# Altium footprint library 8-Crystals.PcbLib: 104 footprints (part 6 of 7)
Each footprint in its own frame and in the unit in brackets; x right, y up, seen from the top. Pads: shape width x height; smd on the part's side, far side on the other; paste and mask are expansions set on the pad; w line width, h text height; cw(c..) or ccw(c..) is an arc to the next point about the centre after c.
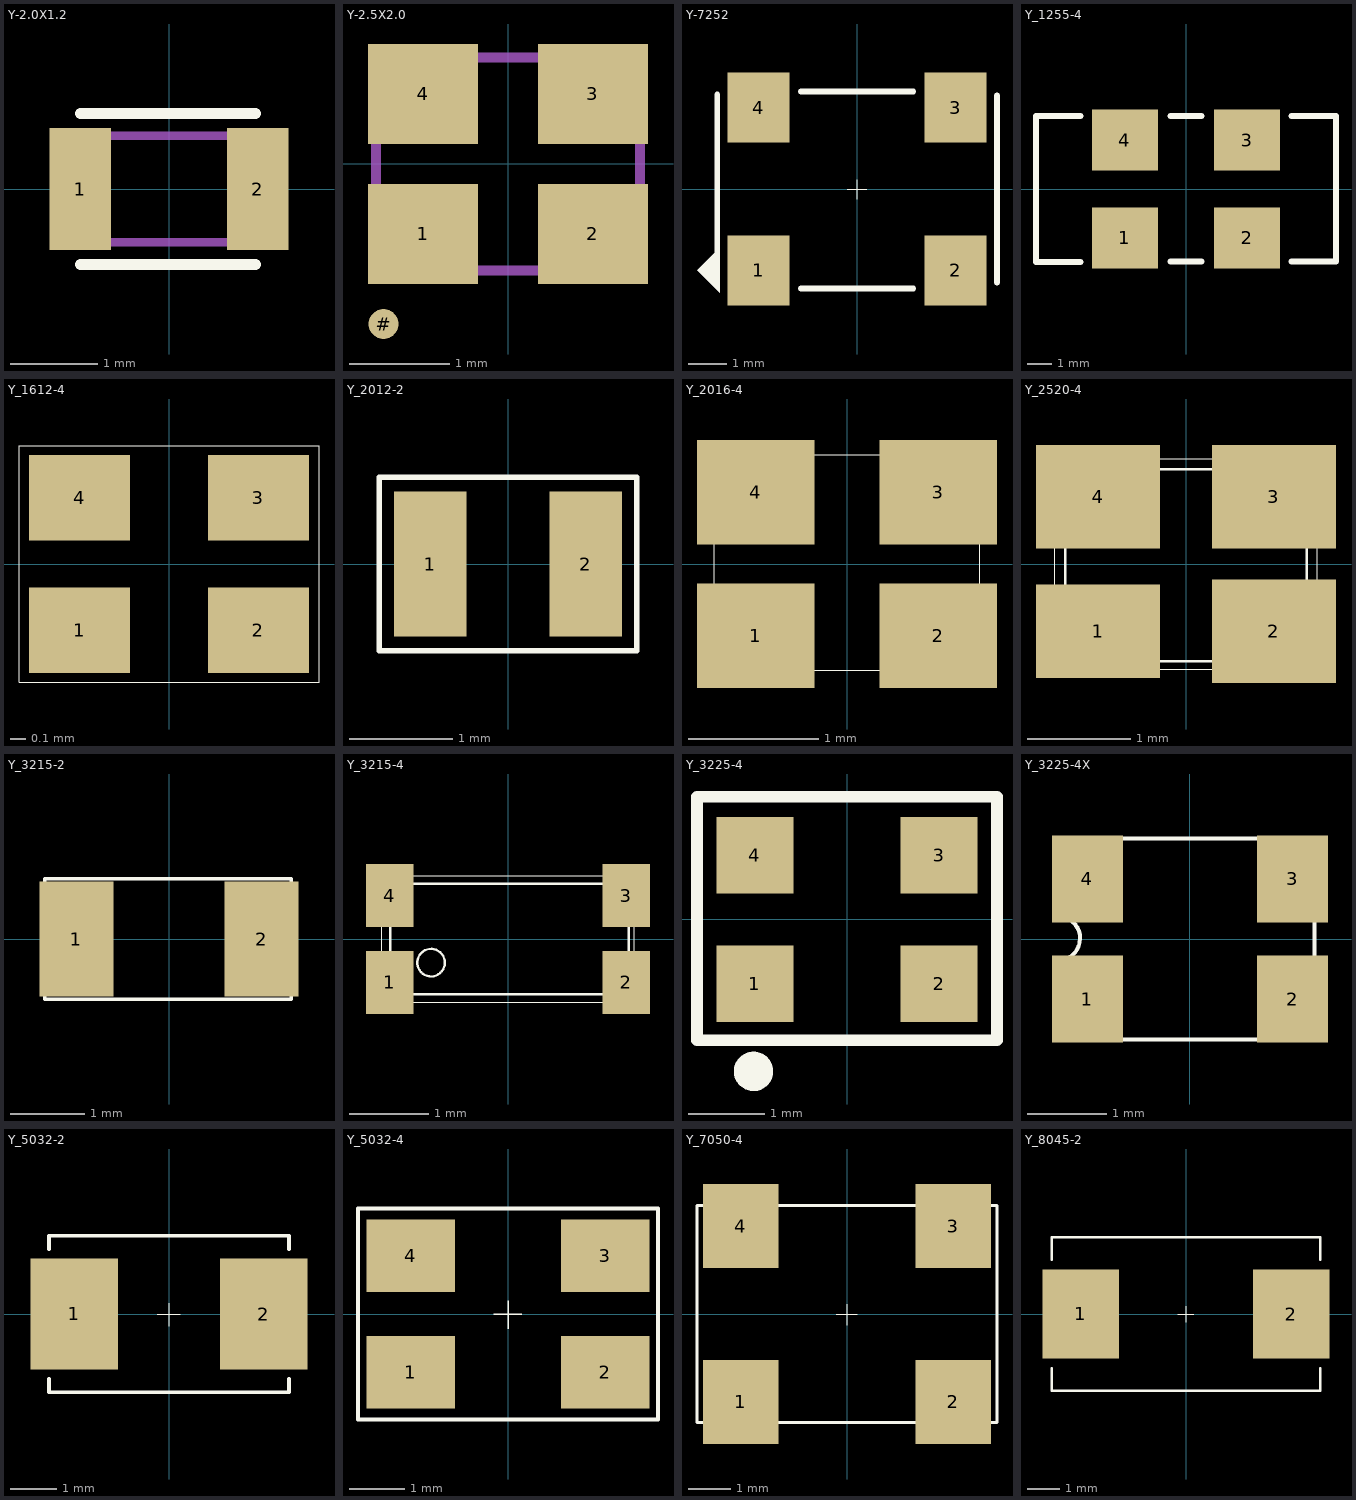
[diagram p5: the footprints below, top view; thin cyan lines are the x and y axes]

## Y-2.0X1.2 [mm]
height 8.78
pads (2):
  rect 0.7x1.4 smd mask+0.07: 1(-1.016,0) 2(1.016,0)
Top Overlay:
  lines w0.127: -1.009,-0.864 0.991,-0.864 ; -1.009,0.864 0.991,0.864
Mechanical 15:
  lines w0.1: -0.991,-0.61 -0.991,0.61 1.016,0.61 1.016,-0.61 -0.991,-0.61
3D body "abs06.stp": height 0.6, standoff 0, extent -1,-0.6 1,0.6
3D body "0_762-1_2.stp": height 0.01, standoff 0, extent 0.635,-0.6 1.397,0.6
3D body "0_762-1_2.stp": height 0.01, standoff 0, extent -1.397,-0.6 -0.635,0.6
3D body "p140-070.stp": height 0.02, standoff 0, extent -1.366,-0.7 -0.666,0.7
3D body "p140-070.stp": height 0.02, standoff 0, extent 0.666,-0.7 1.366,0.7

## Y-2.5X2.0 [mm]
height 8.78
pads (5):
  rect 1.1x1 smd mask+0.07: 1(-0.85,-0.7) 2(0.85,-0.7) 3(0.85,0.7) 4(-0.85,0.7)
  round 0.3 smd mask+0.07: #(-1.245,-1.6)
Mechanical 15:
  lines w0.1: -1.321,-1.067 -1.321,1.067 1.321,1.067 1.321,-1.067 -1.321,-1.067
3D body "p110-100.stp": height 0.02, standoff 0, extent -1.4,-1.2 -0.3,-0.2
3D body "p110-100.stp": height 0.02, standoff 0, extent 0.3,-1.2 1.4,-0.2
3D body "p110-100.stp": height 0.02, standoff 0, extent 0.3,0.2 1.4,1.2
3D body "p110-100.stp": height 0.02, standoff 0, extent -1.4,0.2 -0.3,1.2
3D body "fa-20h.stp": height 0.55, standoff 0, extent -1.255,-1 1.245,1

## Y-7252 [mm]
height 8.78
pads (4):
  rect 1.6x1.8 smd mask+0.051: 1(-2.54,-2.1) 2(2.54,-2.1) 3(2.54,2.1) 4(-2.54,2.1)
Top Overlay:
  region: -3.543,-2.68 -4.127,-2.095 -3.543,-1.511
  lines w0.025: -0.259,0 0.249,0 ; 0,-0.264 0,0.236
  lines w0.15: -3.607,-2.515 -3.607,2.438 ; -1.448,-2.565 1.448,-2.565 ; -1.448,2.515 1.448,2.515 ; 3.607,-2.413 3.607,2.413
3D body "p180-160.stp": height 0.02, standoff 0, extent 1.74,-3 3.34,-1.2
3D body "p180-160.stp": height 0.02, standoff 0, extent -3.34,-3 -1.74,-1.2
3D body "p180-160.stp": height 0.02, standoff 0, extent 1.74,1.2 3.34,3
3D body "p180-160.stp": height 0.02, standoff 0, extent -3.34,1.2 -1.74,3
3D body "y_7050-4.stp": height 1.6, standoff 0, extent -3.505,-2.515 3.495,2.486

## Y_1255-4 [mm]
height 8.78
pads (4):
  rect 2.7x2.5 smd mask+0.051: 1(-2.5,-2) 2(2.5,-2) 3(2.5,2) 4(-2.5,2)
Top Overlay:
  lines w0.25: -4.318,-2.997 -6.147,-2.997 -6.147,2.997 -4.318,2.997 ; -0.635,-2.972 0.635,-2.972 ; -0.635,2.997 0.635,2.997 ; 4.318,-2.972 6.147,-2.972 6.147,2.997 4.318,2.997
3D body "p270-250.stp": height 0.02, standoff 0, extent 1.15,-3.25 3.85,-0.75
3D body "p270-250.stp": height 0.02, standoff 0, extent -3.85,-3.25 -1.15,-0.75
3D body "p270-250.stp": height 0.02, standoff 0, extent 1.15,0.75 3.85,3.25
3D body "p270-250.stp": height 0.02, standoff 0, extent -3.85,0.75 -1.15,3.25
3D body "y_1255-4.stp": height 1.8, standoff -0.03, extent -5.882,-2.75 5.918,2.75

## Y_1612-4 [mm]
height 8.78
pads (4):
  rect 0.65x0.55 smd mask+0.051: 1(-0.575,-0.425) 2(0.575,-0.425) 3(0.575,0.425) 4(-0.575,0.425)
Top Overlay:
  circle w0.025: c-0.457,-0.305 r0.076
  lines w0.005: -0.965,-0.762 -0.965,0.762 0.965,0.762 0.965,-0.762 -0.965,-0.762
3D body "y_1612-4.stp": height 0.3, standoff 0, extent -0.813,-0.6 0.788,0.6
3D body "p065-055.stp": height 0.02, standoff 0, extent -0.9,0.15 -0.25,0.7
3D body "p065-055.stp": height 0.02, standoff 0, extent 0.25,0.15 0.9,0.7
3D body "p065-055.stp": height 0.02, standoff 0, extent 0.25,-0.7 0.9,-0.15
3D body "p065-055.stp": height 0.02, standoff 0, extent -0.9,-0.7 -0.25,-0.15

## Y_2012-2 [mm]
height 8.78
pads (2):
  rect 0.7x1.4 smd: 1(-0.75,0) 2(0.75,0)
Top Overlay:
  lines w0.051: -1.245,-0.838 -1.245,0.838 1.245,0.838 1.245,-0.838 -1.245,-0.838
3D body "p140-070.stp": height 0.02, standoff 0, extent 0.4,-0.7 1.1,0.7
3D body "p140-070.stp": height 0.02, standoff 0, extent -1.1,-0.7 -0.4,0.7
3D body "y_2012-2.stp": height 0.6, standoff 0, extent -1.009,-0.6 0.991,0.6

## Y_2016-4 [mm]
height 8.78
pads (4):
  rect 0.9x0.8 smd mask+0.051: 1(-0.7,-0.55) 2(0.7,-0.55) 3(0.7,0.55) 4(-0.7,0.55)
Top Overlay:
  circle w0.025: c-0.635,-0.432 r0.178
  lines w0.005: -1.016,-0.813 -1.016,0.838 1.016,0.838 1.016,-0.813 -1.016,-0.813
3D body "p090-080.stp": height 0.02, standoff 0, extent -1.15,-0.95 -0.25,-0.15
3D body "p090-080.stp": height 0.02, standoff 0, extent 0.25,-0.95 1.15,-0.15
3D body "p090-080.stp": height 0.02, standoff 0, extent 0.25,0.15 1.15,0.95
3D body "p090-080.stp": height 0.02, standoff 0, extent -1.15,0.15 -0.25,0.95
3D body "y_2016-4.stp": height 0.45, standoff 0, extent -1,-0.787 1,0.813

## Y_2520-4 [mm]
height 8.78
pads (4):
  rect 1.2x0.9 smd mask+0.051: 1(-0.85,-0.65)
  rect 1.2x1 smd mask+0.051: 2(0.85,-0.65) 3(0.85,0.65) 4(-0.85,0.65)
Top Overlay:
  circle w0.025: c-0.737,-0.559 r0.152
  lines w0.005: -1.27,-1.016 1.27,-1.016 1.27,1.016 -1.27,1.016 -1.27,-1.016
  lines w0.025: -1.168,-0.889 cw(c-1.168,-0.94) -1.118,-0.94 1.118,-0.94 cw(c1.168,-0.94) 1.168,-0.889 1.168,0.864 cw(c1.168,0.914) 1.118,0.914 -1.118,0.914 cw(c-1.168,0.914) -1.168,0.864 -1.168,-0.889
3D body "p120-100.stp": height 0.02, standoff 0, extent -1.45,-1.15 -0.25,-0.15
3D body "p120-100.stp": height 0.02, standoff 0, extent 0.25,-1.15 1.45,-0.15
3D body "p120-100.stp": height 0.02, standoff 0, extent 0.25,0.15 1.45,1.15
3D body "p120-100.stp": height 0.02, standoff 0, extent -1.45,0.15 -0.25,1.15
3D body "y_2520-4.stp": height 0.45, standoff -0.01, extent -1.255,-1 1.245,1

## Y_3215-2 [mm]
height 8.78
pads (2):
  rect 1x1.55 smd: 1(-1.25,0) 2(1.25,0)
Top Overlay:
  lines w0.051: -1.676,-0.813 1.651,-0.813 1.651,0.813 -1.676,0.813 -1.676,-0.813
3D body "y_3215-2.stp": height 0.8, standoff 0, extent -1.626,-0.762 1.574,0.738
3D body "p155-100.stp": height 0.02, standoff 0, extent -1.75,-0.775 -0.75,0.775
3D body "p155-100.stp": height 0.02, standoff 0, extent 0.75,-0.775 1.75,0.775

## Y_3215-4 [mm]
height 8.78
pads (4):
  rect 0.6x0.8 smd mask+0.051: 1(-1.5,-0.55) 2(1.5,-0.55) 3(1.5,0.55) 4(-1.5,0.55)
Top Overlay:
  circle w0.03: c-0.974,-0.3 r0.174
  lines w0.01: -1.6,-0.8 -1.6,0.8 1.6,0.8 1.6,-0.8 -1.6,-0.8
  lines w0.03: -1.49,-0.7 1.53,-0.7 1.53,0.7 -1.49,0.7 -1.49,-0.7
3D body "y_3215-4.stp": height 0.91, standoff 0, extent -1.6,-0.737 1.6,0.763
3D body "p080-060.stp": height 0.02, standoff 0, extent -1.8,0.15 -1.2,0.95
3D body "p080-060.stp": height 0.02, standoff 0, extent -1.8,-0.95 -1.2,-0.15
3D body "p080-060.stp": height 0.02, standoff 0, extent 1.2,0.15 1.8,0.95
3D body "p080-060.stp": height 0.02, standoff 0, extent 1.2,-0.95 1.8,-0.15

## Y_3225-4 [mm]
height 8.78
pads (4):
  rect 1x1 smd mask+0.051: 1(-1.2,-0.838) 2(1.2,-0.838) 3(1.2,0.838) 4(-1.2,0.838)
Top Overlay:
  circle w0.254: c-1.219,-1.981 r0.13
  lines w0.15: -1.956,-1.575 1.956,-1.575 1.956,1.6 -1.956,1.6 -1.956,-1.575
3D body "p100-100.stp": height 0.02, standoff 0, extent 0.7,-1.338 1.7,-0.338
3D body "p100-100.stp": height 0.02, standoff 0, extent 0.7,0.338 1.7,1.338
3D body "p100-100.stp": height 0.02, standoff 0, extent -1.7,-1.338 -0.7,-0.338
3D body "p100-100.stp": height 0.02, standoff 0, extent -1.7,0.338 -0.7,1.338
3D body "y_3225-4.stp": height 0.86, standoff -0.02, extent -1.6,-1.245 1.6,1.255

## Y_3225-4X [mm]
height 8.78
pads (4):
  rect 0.9x1.1 smd mask+0.051: 1(-1.3,-0.762) 2(1.3,-0.762) 3(1.3,0.762) 4(-1.3,0.762)
Top Overlay:
  lines w0.025: -1.575,-1.143 -1.702,-1.143 -1.702,-0.381 -1.575,-0.381 ; -1.575,0.381 -1.702,0.381 -1.702,1.143 -1.575,1.143 ; 1.575,-1.143 1.702,-1.143 1.702,-0.381 1.575,-0.381 ; 1.575,0.381 1.702,0.381 1.702,1.143 1.575,1.143
  lines w0.051: -1.575,0.268 -1.575,1.27 1.575,1.27 1.575,-1.27 -1.575,-1.27 -1.575,-0.254 ccw(c-1.67,0.009) -1.567,0.268
3D body "y_3225-4.stp": height 0.86, standoff -0.02, extent -1.6,-1.245 1.6,1.255
3D body "p110-090.stp": height 0.02, standoff 0, extent -1.75,0.212 -0.85,1.312
3D body "p110-090.stp": height 0.02, standoff 0, extent 0.85,0.212 1.75,1.312
3D body "p110-090.stp": height 0.02, standoff 0, extent 0.85,-1.312 1.75,-0.212
3D body "p110-090.stp": height 0.02, standoff 0, extent -1.75,-1.312 -0.85,-0.212

## Y_5032-2 [mm]
height 8.78
pads (2):
  rect 1.9x2.4 smd mask+0.051: 1(-2.05,0) 2(2.05,0)
Top Overlay:
  lines w0.025: -0.259,0 0.249,0 ; 0,-0.264 0,0.236
  lines w0.076: -2.6,-1.4 -2.6,-1.7 2.6,-1.7 2.6,-1.4 ; -2.6,1.4 -2.6,1.7 2.6,1.7 2.6,1.4
3D body "p240-190.stp": height 0.02, standoff 0, extent 1.1,-1.2 3,1.2
3D body "p240-190.stp": height 0.02, standoff 0, extent -3,-1.2 -1.1,1.2
3D body "y_5032.stp": height 1.1, standoff 0, extent -2.5,-1.6 2.5,1.6

## Y_5032-4 [mm]
height 8.78
pads (4):
  rect 1.6x1.3 smd mask+0.051: 1(-1.75,-1.05) 2(1.75,-1.05) 3(1.75,1.05) 4(-1.75,1.05)
Top Overlay:
  lines w0.025: -0.259,0 0.249,0 ; 0,-0.264 0,0.236
  lines w0.076: -2.7,-1.9 -2.7,1.9 2.7,1.9 2.7,-1.9 -2.7,-1.9
3D body "y_5032-4.stp": height 0.7, standoff 0, extent -2.462,-1.55 2.438,1.55
3D body "p160-130.stp": height 0.02, standoff 0, extent -2.55,0.4 -0.95,1.7
3D body "p160-130.stp": height 0.02, standoff 0, extent 0.95,0.4 2.55,1.7
3D body "p160-130.stp": height 0.02, standoff 0, extent 0.95,-1.7 2.55,-0.4
3D body "p160-130.stp": height 0.02, standoff 0, extent -2.55,-1.7 -0.95,-0.4

## Y_7050-4 [mm]
height 8.78
pads (4):
  rect 1.8x2 smd mask+0.051: 1(-2.54,-2.1) 2(2.54,-2.1) 3(2.54,2.1) 4(-2.54,2.1)
Top Overlay:
  lines w0.025: -0.259,0 0.249,0 ; 0,-0.264 0,0.236
  lines w0.076: -3.581,-2.591 -3.581,2.591 3.581,2.591 3.581,-2.591 -3.581,-2.591
3D body "y_7050-4.stp": height 1.6, standoff 0, extent -3.505,-2.515 3.495,2.486
3D body "p200-180.stp": height 0.02, standoff 0, extent -3.44,1.1 -1.64,3.1
3D body "p200-180.stp": height 0.02, standoff 0, extent 1.64,1.1 3.44,3.1
3D body "p200-180.stp": height 0.02, standoff 0, extent -3.44,-3.1 -1.64,-1.1
3D body "p200-180.stp": height 0.02, standoff 0, extent 1.64,-3.1 3.44,-1.1

## Y_8045-2 [mm]
height 8.78
pads (2):
  rect 2.4x2.8 smd mask+0.051: 1(-3.3,0) 2(3.3,0)
Top Overlay:
  lines w0.025: -0.259,0 0.249,0 ; 0,-0.264 0,0.236
  lines w0.076: -4.2,-1.7 -4.2,-2.4 4.2,-2.4 4.2,-1.7 ; -4.2,1.7 -4.2,2.4 4.2,2.4 4.2,1.7
3D body "y_8045-2.stp": height 1.8, standoff 0, extent -3.988,-2.261 4.012,2.239
3D body "p270-250.stp": height 0.02, standoff 0, extent -4.552,-1.35 -2.052,1.35
3D body "p270-250.stp": height 0.02, standoff 0, extent 2.052,-1.35 4.552,1.35